# Altium footprint library Generic Footprint.PcbLib: 160 footprints (part 8 of 20)
Each footprint in its own frame and in the unit in brackets; x right, y up, seen from the top. Pads: shape width x height; smd on the part's side, far side on the other; paste and mask are expansions set on the pad; w line width, h text height; cw(c..) or ccw(c..) is an arc to the next point about the centre after c.
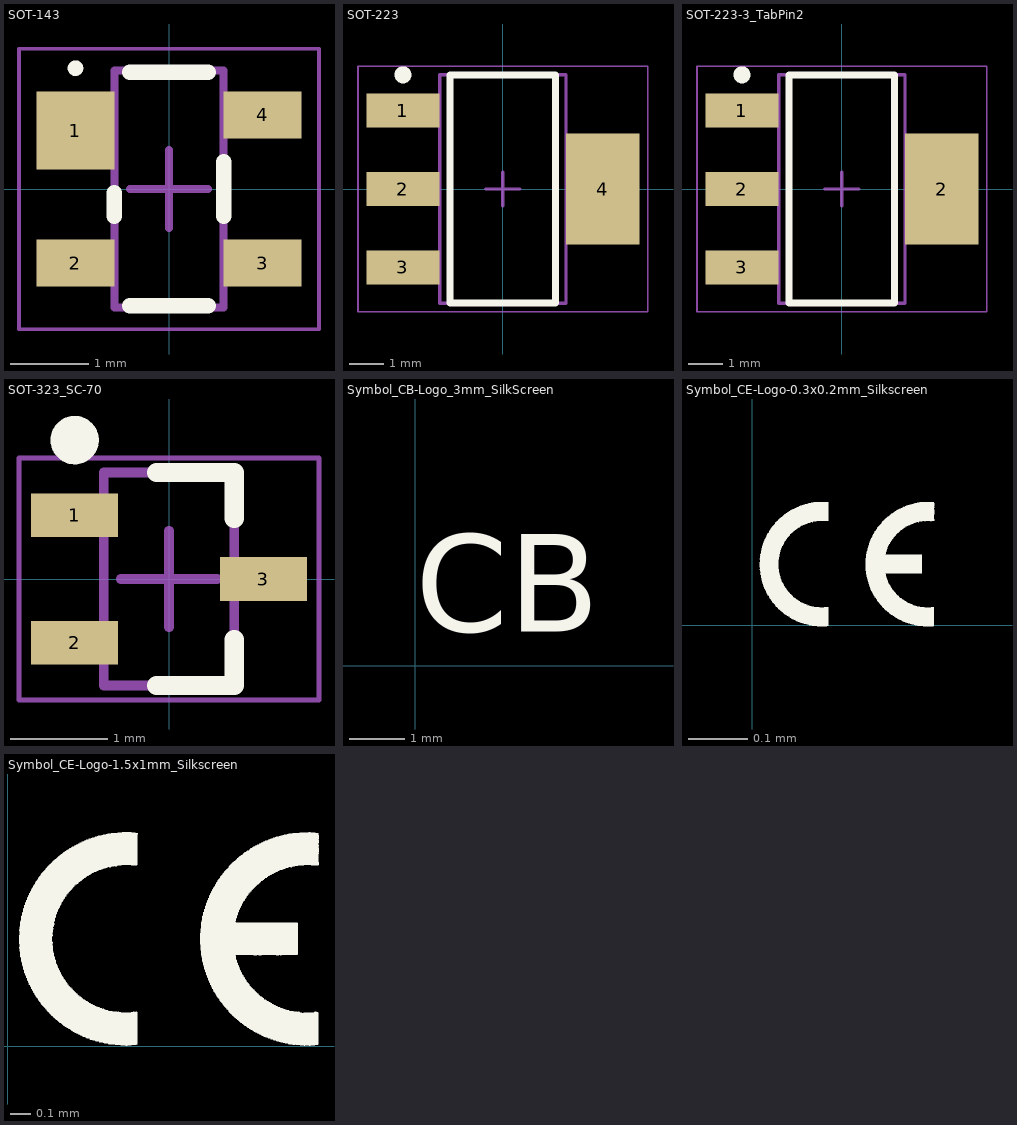
[diagram p7: the footprints below, top view; thin cyan lines are the x and y axes]

## SOT-143 [mm] "SOT143, 4-Leads, Body 2.92x2.37mm, Pitch 1.90mm, IPC Medium Density"
height 1.2
pads (4):
  rect 1x1 smd: 1(-1.2,0.75)
  rect 1x0.6 smd: 2(-1.2,-0.95) 3(1.2,-0.95) 4(1.2,0.95)
Top Overlay:
  circle w0.1: c-1.2,1.55 r0.05
  lines w0.2: -0.7,-0.35 -0.7,-0.05 ; -0.5,-1.5 0.5,-1.5 ; -0.5,1.5 0.5,1.5 ; 0.7,-0.35 0.7,0.35
Courtyard Top:
  lines w0.05: -1.925,-1.8 -1.925,1.8 1.925,1.8 1.925,-1.8 -1.925,-1.8
  lines w0.1: -0.5,0 0.5,0 ; 0,-0.5 0,0.5
Assembly Top:
  lines w0.1: -0.7,-1.52 -0.7,1.52 0.7,1.52 0.7,-1.52 -0.7,-1.52
3D body "SOT-143.step": height 1.2, standoff 0.12, extent -0.855,-1.52 0.855,1.52

## SOT-223 [mm] "SOT223, 4-Leads, Body 6.50x7.00mm (avg), Pitch 2.30mm, IPC Medium Density"
height 1.8
pads (4):
  rect 2.15x1 smd: 1(-2.93,2.3) 2(-2.93,0) 3(-2.93,-2.3)
  rect 2.15x3.25 smd: 4(2.93,0)
Top Overlay:
  circle w0.25: c-2.93,3.35 r0.125
  lines w0.2: -1.55,-3.35 1.55,-3.35 1.55,3.35 -1.55,3.35 -1.55,-3.35
Courtyard Top:
  lines w0.05: -4.25,-3.6 4.25,-3.6 4.25,3.6 -4.25,3.6 -4.25,-3.6
  lines w0.1: -0.5,0 0.5,0 ; 0,-0.5 0,0.5
Assembly Top:
  lines w0.1: -1.855,-3.35 1.855,-3.35 1.855,3.35 -1.855,3.35 -1.855,-3.35
3D body "SOT-223-3_TabPin2.step": height 1.8, standoff 0, extent -3.5,-3.35 3.5,3.35

## SOT-223-3_TabPin2 [mm] "SOT223, 4-Leads, Body 6.50x7.00mm (avg), Pitch 2.30mm, IPC Medium Density"
height 1.8
pads (4):
  rect 2.15x1 smd: 1(-2.93,2.3) 2(-2.93,0) 3(-2.93,-2.3)
  rect 2.15x3.25 smd: 2(2.93,0)
Top Overlay:
  circle w0.25: c-2.93,3.35 r0.125
  lines w0.2: -1.55,-3.35 1.55,-3.35 1.55,3.35 -1.55,3.35 -1.55,-3.35
Courtyard Top:
  lines w0.05: -4.25,-3.6 4.25,-3.6 4.25,3.6 -4.25,3.6 -4.25,-3.6
  lines w0.1: -0.5,0 0.5,0 ; 0,-0.5 0,0.5
Assembly Top:
  lines w0.1: -1.855,-3.35 1.855,-3.35 1.855,3.35 -1.855,3.35 -1.855,-3.35
3D body "SOT-223-3_TabPin2.step": height 1.8, standoff 0, extent -3.5,-3.35 3.5,3.35

## SOT-323_SC-70 [mm] "SOT323 SC70-3, 3-Leads, Body 2.00x2.20mm, Pitch 0.66mm, IPC Medium Density"
height 0.9
pads (3):
  rect 0.9x0.45 smd: 1(-0.975,0.66) 2(-0.975,-0.66) 3(0.975,0)
Top Overlay:
  circle w0.25: c-0.975,1.435 r0.125
  lines w0.2: -0.125,-1.1 0.675,-1.1 0.675,-0.625 ; -0.125,1.1 0.675,1.1 0.675,0.625
Courtyard Top:
  lines w0.05: -1.55,-1.25 -1.55,1.25 1.55,1.25 1.55,-1.25 -1.55,-1.25
  lines w0.1: -0.5,0 0.5,0 ; 0,-0.5 0,0.5
Assembly Top:
  lines w0.1: -0.675,-1.1 -0.675,1.1 0.675,1.1 0.675,-1.1 -0.675,-1.1
3D body "SOT-323_SC-70.step": height 0.9, standoff 0, extent -1.1,-1.098 1.1,1.098

## Symbol_CB-Logo_3mm_SilkScreen [mm]
Top Overlay:
  text "CB" at 0,0.033 h3

## Symbol_CE-Logo-0.3x0.2mm_Silkscreen [mm]
Top Overlay:
  drawing of 1554 lines, arcs and shapes, not listed

## Symbol_CE-Logo-1.5x1mm_Silkscreen [mm]
pads (3108):
  round 0.01 on Top Overlay: 1(0.061,0.488) 1(0.061,0.511) 1(0.061,0.512) 1(0.061,0.514) 1(0.061,0.515) 1(0.061,0.517) 1(0.061,0.518) 1(0.061,0.52) 1(0.061,0.524) 1(0.061,0.526) 1(0.061,0.527) 1(0.061,0.529) 1(0.061,0.53) 1(0.061,0.532) 1(0.061,0.533) 1(0.061,0.535) 1(0.061,0.536) 1(0.061,0.538) 1(0.061,0.539) 1(0.061,0.541) 1(0.061,0.542) 1(0.061,0.544) 1(0.061,0.545) 1(0.061,0.547) 1(0.061,0.548) 1(0.061,0.575) 1(0.062,0.476) 1(0.062,0.478) 1(0.062,0.479) 1(0.062,0.481) 1(0.062,0.482) 1(0.062,0.49) 1(0.062,0.491) 1(0.062,0.493) 1(0.062,0.494) 1(0.062,0.496) 1(0.062,0.497) 1(0.062,0.499) 1(0.062,0.5) 1(0.062,0.502) 1(0.062,0.503) 1(0.062,0.505) 1(0.062,0.506) 1(0.062,0.508) 1(0.062,0.509) 1(0.062,0.521) 1(0.062,0.523) 1(0.062,0.55) 1(0.062,0.551) 1(0.062,0.553) 1(0.062,0.554) 1(0.062,0.556) 1(0.062,0.557) 1(0.062,0.559) 1(0.062,0.56) 1(0.062,0.562) 1(0.062,0.563) 1(0.062,0.565) 1(0.062,0.566) 1(0.062,0.568) 1(0.062,0.569) 1(0.062,0.571) 1(0.062,0.572) 1(0.062,0.574) 1(0.062,0.584) 1(0.062,0.586) 1(0.064,0.473) 1(0.064,0.475) 1(0.064,0.484) 1(0.064,0.485) 1(0.064,0.487) 1(0.064,0.577) 1(0.064,0.578) 1(0.064,0.58) 1(0.064,0.581) 1(0.064,0.583) 1(0.064,0.587) 1(0.064,0.589) 1(0.064,0.59) 1(0.065,0.449) 1(0.065,0.592) 1(0.065,0.599) 1(0.065,0.601) 1(0.065,0.602) 1(0.065,0.616) 1(0.067,0.445) 1(0.067,0.446) 1(0.067,0.448) 1(0.067,0.454) 1(0.067,0.455) 1(0.067,0.457) 1(0.067,0.458) 1(0.067,0.46) 1(0.067,0.461) 1(0.067,0.463) 1(0.067,0.464) 1(0.067,0.466) 1(0.067,0.467) 1(0.067,0.469) 1(0.067,0.47) 1(0.067,0.472) 1(0.067,0.593) 1(0.067,0.595) 1(0.067,0.596) 1(0.067,0.598) 1(0.067,0.604) 1(0.067,0.605) 1(0.067,0.607) 1(0.067,0.608) 1(0.067,0.61) 1(0.068,0.451) 1(0.068,0.452) 1(0.068,0.611) 1(0.068,0.613) 1(0.068,0.614) 1(0.068,0.617) 1(0.068,0.619) 1(0.068,0.62) 1(0.071,0.424) 1(0.071,0.425) 1(0.071,0.427) 1(0.071,0.428) 1(0.071,0.43) 1(0.071,0.431) 1(0.071,0.433) 1(0.071,0.434) 1(0.071,0.436) 1(0.071,0.437) 1(0.071,0.439) 1(0.071,0.44) 1(0.071,0.443) 1(0.071,0.622) 1(0.071,0.623) 1(0.071,0.625) 1(0.071,0.626) 1(0.071,0.628) 1(0.071,0.629) 1(0.071,0.631) 1(0.071,0.632) 1(0.071,0.634) 1(0.071,0.635) 1(0.071,0.637) 1(0.071,0.638) 1(0.071,0.644) 1(0.073,0.421) 1(0.073,0.422) 1(0.073,0.442) 1(0.073,0.64) 1(0.073,0.641) 1(0.073,0.643) 1(0.076,0.404) 1(0.076,0.407) 1(0.076,0.409) 1(0.076,0.41) 1(0.076,0.412) 1(0.076,0.413) 1(0.076,0.415) 1(0.076,0.416) 1(0.076,0.418) 1(0.076,0.419) 1(0.076,0.646) 1(0.076,0.647) 1(0.076,0.649) 1(0.076,0.65) 1(0.076,0.652) 1(0.076,0.653) 1(0.076,0.655) 1(0.076,0.656) 1(0.076,0.658) 1(0.076,0.661) 1(0.077,0.401) 1(0.077,0.403) 1(0.077,0.406) 1(0.077,0.659) 1(0.077,0.662) 1(0.079,0.664) 1(0.08,0.394) 1(0.08,0.395) 1(0.08,0.397) 1(0.08,0.4) 1(0.08,0.671) 1(0.08,0.673) 1(0.08,0.674) 1(0.08,0.68) 1(0.082,0.385) 1(0.082,0.386) 1(0.082,0.388) 1(0.082,0.389) 1(0.082,0.391) 1(0.082,0.392) 1(0.082,0.398) 1(0.082,0.665) 1(0.082,0.667) 1(0.082,0.668) 1(0.082,0.67) 1(0.082,0.676) 1(0.082,0.677) 1(0.082,0.679) 1(0.083,0.382) 1(0.083,0.383) 1(0.083,0.682) 1(0.083,0.683) 1(0.085,0.371) 1(0.085,0.694) 1(0.086,0.368) 1(0.086,0.37) 1(0.086,0.373) 1(0.086,0.374) 1(0.086,0.376) 1(0.086,0.377) 1(0.086,0.379) 1(0.086,0.38) 1(0.086,0.685) 1(0.086,0.686) 1(0.086,0.688) 1(0.086,0.689) 1(0.086,0.691) 1(0.086,0.692) 1(0.086,0.697) 1(0.088,0.367) 1(0.088,0.695) 1(0.091,0.358) 1(0.091,0.359) 1(0.091,0.361) 1(0.091,0.362) 1(0.091,0.364) 1(0.091,0.365) 1(0.091,0.698) 1(0.091,0.7) 1(0.091,0.701) 1(0.091,0.703) 1(0.091,0.704) 1(0.091,0.706) 1(0.091,0.707) 1(0.091,0.709) 1(0.092,0.353) 1(0.092,0.355) 1(0.092,0.356) 1(0.092,0.71) 1(0.092,0.712) 1(0.094,0.352) 1(0.095,0.344) 1(0.095,0.347) 1(0.095,0.35) 1(0.095,0.713) 1(0.095,0.715) 1(0.095,0.718) 1(0.095,0.721) 1(0.097,0.346) 1(0.097,0.349) 1(0.097,0.716) 1(0.097,0.719) 1(0.098,0.343) 1(0.1,0.331) 1(0.1,0.332) 1(0.1,0.334) 1(0.1,0.335) 1(0.1,0.337) 1(0.1,0.338) 1(0.1,0.34) 1(0.1,0.341) 1(0.1,0.722) 1(0.1,0.724) 1(0.1,0.725) 1(0.1,0.727) 1(0.1,0.728) 1(0.1,0.73) 1(0.1,0.731) 1(0.101,0.329) 1(0.101,0.733) 1(0.101,0.736) 1(0.103,0.328) 1(0.103,0.734) 1(0.104,0.737) 1(0.104,0.742) 1(0.106,0.32) 1(0.106,0.322) 1(0.106,0.323) 1(0.106,0.325) 1(0.106,0.326) 1(0.106,0.739) 1(0.106,0.74) 1(0.106,0.743) 1(0.106,0.745) 1(0.107,0.319) 1(0.109,0.31) 1(0.109,0.746) 1(0.11,0.311) 1(0.11,0.313) 1(0.11,0.314) 1(0.11,0.316) 1(0.11,0.317) 1(0.11,0.748) 1(0.11,0.749) 1(0.11,0.751) 1(0.11,0.752) 1(0.11,0.754) 1(0.11,0.755) 1(0.113,0.308) 1(0.115,0.301) 1(0.115,0.302) 1(0.115,0.304) 1(0.115,0.305) 1(0.115,0.307) 1(0.115,0.757) 1(0.115,0.758) 1(0.115,0.76) 1(0.115,0.761) 1(0.115,0.763) 1(0.116,0.299) 1(0.116,0.764) 1(0.119,0.29) 1(0.119,0.292) 1(0.119,0.293) 1(0.119,0.295) 1(0.119,0.296) 1(0.119,0.298) 1(0.119,0.766) 1(0.119,0.767) 1(0.119,0.769) 1(0.119,0.77) 1(0.119,0.772) 1(0.119,0.773) 1(0.121,0.775) 1(0.122,0.289) 1(0.124,0.287) 1(0.124,0.776) 1(0.124,0.778) 1(0.124,0.781) 1(0.125,0.281) 1(0.125,0.283) 1(0.125,0.284) 1(0.125,0.286) 1(0.125,0.779) 1(0.125,0.782) 1(0.125,0.784) 1(0.127,0.28) 1(0.13,0.274) 1(0.13,0.275) 1(0.13,0.277) 1(0.13,0.278) 1(0.13,0.785) 1(0.13,0.787) 1(0.13,0.788) 1(0.13,0.79) 1(0.13,0.791) 1(0.13,0.793) 1(0.131,0.271) 1(0.131,0.272) 1(0.133,0.794) 1(0.134,0.268) 1(0.134,0.269) 1(0.134,0.796) 1(0.134,0.797) 1(0.134,0.799) 1(0.136,0.266) 1(0.139,0.259) 1(0.139,0.26) 1(0.139,0.262) 1(0.139,0.263) 1(0.139,0.265) 1(0.139,0.8) 1(0.139,0.802) 1(0.139,0.803) 1(0.14,0.256) 1(0.14,0.257) 1(0.14,0.805) 1(0.14,0.806) 1(0.14,0.808) 1(0.143,0.25) 1(0.143,0.251) 1(0.143,0.253) 1(0.143,0.254) 1(0.143,0.809) 1(0.143,0.811) 1(0.143,0.812) 1(0.143,0.814) 1(0.143,0.815) 1(0.145,0.248) 1(0.145,0.817) 1(0.146,0.247) 1(0.146,0.818) 1(0.148,0.244) 1(0.148,0.245) 1(0.148,0.818) 1(0.149,0.242) 1(0.149,0.818) 1(0.149,0.82) 1(0.149,0.821) 1(0.149,0.823) 1(0.152,0.824) 1(0.154,0.236) 1(0.154,0.238) 1(0.154,0.239) 1(0.154,0.241) 1(0.154,0.826) 1(0.154,0.827) 1(0.154,0.829) 1(0.155,0.83) 1(0.155,0.832) 1(0.158,0.229) 1(0.158,0.23) 1(0.158,0.232) 1(0.158,0.233) 1(0.158,0.235) 1(0.158,0.833) 1(0.158,0.835) 1(0.158,0.836) 1(0.16,0.227) 1(0.163,0.224) 1(0.163,0.226) 1(0.163,0.838) 1(0.163,0.839) 1(0.163,0.842) 1(0.164,0.223) 1(0.164,0.841) 1(0.167,0.217) 1(0.167,0.218) 1(0.167,0.22) 1(0.167,0.221) 1(0.167,0.844) 1(0.167,0.845) 1(0.167,0.847) 1(0.167,0.848) 1(0.169,0.214) 1(0.169,0.215) 1(0.169,0.85) 1(0.169,0.851) 1(0.172,0.209) 1(0.172,0.212) 1(0.172,0.853) 1(0.173,0.211) 1(0.173,0.854) 1(0.173,0.856) 1(0.175,0.208) 1(0.178,0.203) 1(0.178,0.205) 1(0.178,0.206) 1(0.178,0.857) 1(0.178,0.859) 1(0.178,0.86) 1(0.179,0.862) 1(0.182,0.199) 1(0.182,0.2) 1(0.182,0.202) 1(0.182,0.863) 1(0.182,0.865) 1(0.182,0.866) 1(0.187,0.194) 1(0.187,0.196) 1(0.187,0.197) 1(0.187,0.868) 1(0.187,0.869) 1(0.187,0.871) 1(0.19,0.193) 1(0.191,0.188) 1(0.191,0.19) 1(0.191,0.191) 1(0.191,0.872) 1(0.191,0.874) 1(0.191,0.875) 1(0.191,0.877) 1(0.193,0.878) 1(0.193,0.88) 1(0.194,0.188) 1(0.196,0.184) 1(0.196,0.188) 1(0.196,0.881) 1(0.197,0.181) 1(0.197,0.182) 1(0.197,0.185) 1(0.197,0.187) 1(0.197,0.883) 1(0.197,0.884) 1(0.199,0.179) 1(0.199,0.886) 1(0.202,0.175) 1(0.202,0.176) 1(0.202,0.178) 1(0.202,0.887) 1(0.202,0.889) 1(0.202,0.89) 1(0.205,0.173) 1(0.206,0.892) 1(0.206,0.893) 1(0.206,0.895) 1(0.208,0.17) 1(0.208,0.172) 1(0.209,0.169) 1(0.211,0.166) 1(0.211,0.167) 1(0.211,0.896) 1(0.211,0.898) 1(0.211,0.899) 1(0.214,0.164) 1(0.215,0.163) 1(0.215,0.506) 1(0.215,0.508) 1(0.215,0.509) 1(0.215,0.511) 1(0.215,0.517) 1(0.215,0.518) 1(0.215,0.52) 1(0.215,0.521) 1(0.215,0.523) 1(0.215,0.524) 1(0.215,0.526) 1(0.215,0.527) 1(0.215,0.529) 1(0.215,0.53) 1(0.215,0.532) 1(0.215,0.533) 1(0.215,0.535) 1(0.215,0.536) 1(0.215,0.538) 1(0.215,0.539) 1(0.215,0.541) 1(0.215,0.542) 1(0.215,0.544) 1(0.215,0.545) 1(0.215,0.547) 1(0.215,0.548) 1(0.215,0.554) 1(0.215,0.556) 1(0.215,0.557) 1(0.215,0.559) 1(0.215,0.901) 1(0.215,0.902) 1(0.217,0.16) 1(0.217,0.161) 1(0.217,0.5) 1(0.217,0.502) 1(0.217,0.503) 1(0.217,0.505) 1(0.217,0.512) 1(0.217,0.515) 1(0.217,0.55) 1(0.217,0.56) 1(0.217,0.562) 1(0.217,0.563) 1(0.217,0.565) 1(0.217,0.566) 1(0.217,0.904) 1(0.218,0.485) 1(0.218,0.487) 1(0.218,0.488) 1(0.218,0.491) 1(0.218,0.493) 1(0.218,0.494) 1(0.218,0.496) 1(0.218,0.497) 1(0.218,0.499) 1(0.218,0.514) 1(0.218,0.551) 1(0.218,0.553) 1(0.218,0.568) 1(0.218,0.569) 1(0.218,0.571) 1(0.218,0.572) 1(0.218,0.574) 1(0.218,0.575) 1(0.218,0.578) 1(0.218,0.58) 1(0.218,0.581) 1(0.218,0.583) 1(0.218,0.589) 1(0.218,0.596) 1(0.22,0.467) 1(0.22,0.469) 1(0.22,0.47) 1(0.22,0.472) 1(0.22,0.473) 1(0.22,0.475) 1(0.22,0.476) 1(0.22,0.478) 1(0.22,0.479) 1(0.22,0.481) 1(0.22,0.482) 1(0.22,0.484) 1(0.22,0.49) 1(0.22,0.577) 1(0.22,0.586) 1(0.22,0.587) 1(0.22,0.59) 1(0.22,0.592) 1(0.22,0.593) 1(0.22,0.595) 1(0.22,0.905) 1(0.221,0.155) 1(0.221,0.157) 1(0.221,0.158) 1(0.221,0.584) 1(0.221,0.598) 1(0.221,0.907) 1(0.221,0.908) 1(0.223,0.457) 1(0.223,0.461) 1(0.223,0.463) 1(0.223,0.464) 1(0.223,0.466) 1(0.223,0.598) 1(0.223,0.599) 1(0.223,0.601) 1(0.223,0.602) 1(0.223,0.91) 1(0.224,0.443) 1(0.224,0.445) 1(0.224,0.446) 1(0.224,0.448) 1(0.224,0.449) 1(0.224,0.451) 1(0.224,0.452) 1(0.224,0.454) 1(0.224,0.455) 1(0.224,0.458) 1(0.224,0.46) 1(0.224,0.598) 1(0.224,0.604) 1(0.224,0.61) 1(0.224,0.611) 1(0.224,0.613) 1(0.224,0.614) 1(0.224,0.616) 1(0.224,0.617) 1(0.224,0.619) 1(0.224,0.62) 1(0.226,0.152) 1(0.226,0.154) 1(0.226,0.605) 1(0.226,0.607) 1(0.226,0.608) 1(0.226,0.622) 1(0.226,0.911) 1(0.226,0.913) 1(0.226,0.914) 1(0.227,0.151) 1(0.227,0.44) 1(0.227,0.626) 1(0.229,0.149) 1(0.229,0.428) 1(0.229,0.43) 1(0.229,0.431) 1(0.229,0.433) 1(0.229,0.434) 1(0.229,0.436) 1(0.229,0.437) 1(0.229,0.439) 1(0.229,0.442) 1(0.229,0.623) 1(0.229,0.625) 1(0.229,0.628) 1(0.229,0.629) 1(0.229,0.631) 1(0.229,0.632) 1(0.229,0.634) 1(0.229,0.64) 1(0.23,0.148) 1(0.23,0.635) 1(0.23,0.637) 1(0.23,0.638) 1(0.23,0.916) 1(0.23,0.917) 1(0.232,0.146) 1(0.232,0.424) 1(0.232,0.425) 1(0.232,0.641) 1(0.232,0.919) 1(0.233,0.145) 1(0.233,0.41) 1(0.233,0.413) 1(0.233,0.415) 1(0.233,0.416) 1(0.233,0.418) 1(0.233,0.419) 1(0.233,0.421) 1(0.233,0.422) 1(0.233,0.427) 1(0.233,0.644) 1(0.233,0.649) 1(0.233,0.65) 1(0.233,0.652) 1(0.235,0.409) 1(0.235,0.412) 1(0.235,0.643) 1(0.235,0.646) 1(0.235,0.647) 1(0.235,0.653) 1(0.235,0.655) 1(0.235,0.92) 1(0.235,0.922) 1(0.236,0.656) 1(0.238,0.401) 1(0.238,0.406) 1(0.238,0.407) 1(0.238,0.658) 1(0.238,0.659) 1(0.238,0.661) 1(0.238,0.662) 1(0.238,0.665) 1(0.238,0.668) 1(0.238,0.923) 1(0.239,0.14) 1(0.239,0.4) 1(0.239,0.403) 1(0.239,0.404) 1(0.239,0.664) 1(0.239,0.667) 1(0.239,0.67) 1(0.241,0.137) 1(0.241,0.139) 1(0.241,0.142) 1(0.241,0.143) 1(0.242,0.136) 1(0.242,0.386) 1(0.242,0.389) 1(0.242,0.394) 1(0.242,0.395) 1(0.242,0.397) 1(0.242,0.398) 1(0.242,0.673) 1(0.242,0.677) 1(0.244,0.385) 1(0.244,0.388) 1(0.244,0.391) 1(0.244,0.392) 1(0.244,0.671) 1(0.244,0.674) 1(0.244,0.676) 1(0.244,0.679) 1(0.244,0.925) 1(0.244,0.928) 1(0.245,0.68) 1(0.245,0.926) 1(0.245,0.929) 1(0.247,0.682) 1(0.248,0.376) 1(0.248,0.377) 1(0.248,0.379) 1(0.248,0.38) 1(0.248,0.382) 1(0.248,0.383) 1(0.248,0.683) 1(0.248,0.685) 1(0.248,0.686) 1(0.248,0.688) 1(0.25,0.131) 1(0.25,0.133) 1(0.25,0.134) 1(0.25,0.689) 1(0.25,0.931) 1(0.25,0.932) 1(0.25,0.934) 1(0.251,0.691) 1(0.253,0.367) 1(0.253,0.368) 1(0.253,0.37) 1(0.253,0.373) 1(0.253,0.374) 1(0.253,0.692) 1(0.253,0.694) 1(0.253,0.695) 1(0.253,0.697) 1(0.254,0.127) 1(0.254,0.128) 1(0.254,0.13) 1(0.254,0.365) 1(0.254,0.371) 1(0.254,0.698) 1(0.254,0.935) 1(0.254,0.937) 1(0.254,0.938) 1(0.256,0.7) 1(0.257,0.125) 1(0.257,0.364) 1(0.257,0.701) 1(0.257,0.703) 1(0.257,0.704) 1(0.259,0.124) 1(0.259,0.356) 1(0.259,0.358) 1(0.259,0.359) 1(0.259,0.361) 1(0.259,0.362) 1(0.259,0.706) 1(0.259,0.707) 1(0.259,0.94) 1(0.26,0.122) 1(0.26,0.941) 1(0.26,0.943) 1(0.262,0.121) 1(0.262,0.349) 1(0.262,0.352) 1(0.262,0.353) 1(0.262,0.355) 1(0.262,0.709) 1(0.262,0.71) 1(0.262,0.712) 1(0.262,0.713) 1(0.262,0.715) 1(0.263,0.121) 1(0.263,0.347) 1(0.263,0.35) 1(0.263,0.716) 1(0.263,0.718) 1(0.263,0.944) 1(0.265,0.121) 1(0.265,0.946) 1(0.266,0.121) 1(0.266,0.343) 1(0.266,0.346) 1(0.266,0.719) 1(0.266,0.947) 1(0.268,0.121) 1(0.268,0.341) 1(0.268,0.344) 1(0.268,0.721) 1(0.268,0.722) 1(0.268,0.724) 1(0.268,0.725) 1(0.268,0.727) 1(0.268,0.949) 1(0.269,0.116) 1(0.269,0.118) 1(0.269,0.119) 1(0.269,0.949) 1(0.271,0.116) 1(0.271,0.34) 1(0.272,0.116) 1(0.272,0.332) 1(0.272,0.334) 1(0.272,0.335) 1(0.272,0.337) 1(0.272,0.338) 1(0.272,0.728) 1(0.272,0.73) 1(0.272,0.731) 1(0.274,0.112) 1(0.274,0.113) 1(0.274,0.115) 1(0.274,0.733) 1(0.274,0.949) 1(0.274,0.95) 1(0.274,0.952) 1(0.274,0.953) 1(0.277,0.329) 1(0.277,0.331) 1(0.277,0.734) 1(0.277,0.736) 1(0.278,0.107) 1(0.278,0.109) 1(0.278,0.11) 1(0.278,0.328) 1(0.278,0.737) 1(0.278,0.739) 1(0.278,0.74) 1(0.278,0.742) 1(0.278,0.955) 1(0.278,0.956) 1(0.28,0.326) 1(0.28,0.958) 1(0.281,0.32) 1(0.281,0.323) 1(0.281,0.325) 1(0.281,0.743) 1(0.283,0.317) 1(0.283,0.319) 1(0.283,0.322) 1(0.283,0.745) 1(0.283,0.746) 1(0.283,0.748) 1(0.284,0.748) 1(0.284,0.959) 1(0.284,0.961) 1(0.286,0.748) 1(0.286,0.749) 1(0.286,0.752) 1(0.286,0.755) 1(0.286,0.962) 1(0.287,0.103) 1(0.287,0.106) 1(0.287,0.313) 1(0.287,0.314) 1(0.287,0.316) 1(0.287,0.751) 1(0.287,0.754) 1(0.287,0.757) 1(0.289,0.101) 1(0.289,0.104) 1(0.29,0.311) 1(0.292,0.304) 1(0.292,0.305) 1(0.292,0.307) 1(0.292,0.308) 1(0.292,0.31) 1(0.292,0.758) 1(0.292,0.76) 1(0.293,0.098) 1(0.293,0.1) 1(0.293,0.302) 1(0.293,0.761) 1(0.293,0.964) 1(0.293,0.965) 1(0.293,0.967) 1(0.295,0.302) 1(0.295,0.968) 1(0.296,0.097) 1(0.296,0.299) 1(0.296,0.301) 1(0.296,0.302) 1(0.296,0.763) 1(0.296,0.764) 1(0.296,0.766) 1(0.296,0.968) 1(0.298,0.298) 1(0.298,0.968) 1(0.298,0.97) 1(0.299,0.767) 1(0.299,0.971) 1(0.301,0.296) 1(0.301,0.769) 1(0.302,0.094) 1(0.302,0.095) 1(0.302,0.293) 1(0.302,0.295) 1(0.302,0.77) 1(0.304,0.092) 1(0.304,0.772) 1(0.305,0.292) 1(0.305,0.773) 1(0.307,0.289) 1(0.307,0.29) 1(0.307,0.775) 1(0.307,0.776) 1(0.307,0.976) 1(0.308,0.973) 1(0.308,0.974) 1(0.308,0.977) 1(0.31,0.778) 1(0.311,0.284) 1(0.311,0.286) 1(0.311,0.287) 1(0.311,0.779) 1(0.311,0.781) 1(0.313,0.088) 1(0.313,0.089) 1(0.313,0.091) 1(0.314,0.782) 1(0.316,0.278) 1(0.316,0.28) 1(0.316,0.281) 1(0.316,0.283) 1(0.316,0.784) 1(0.316,0.785) 1(0.316,0.787) 1(0.316,0.788) 1(0.316,0.79) 1(0.317,0.083) 1(0.317,0.085) 1(0.317,0.086) 1(0.317,0.791) 1(0.317,0.979) 1(0.317,0.98) 1(0.317,0.982) 1(0.319,0.791) 1(0.32,0.082) 1(0.32,0.274) 1(0.32,0.277) 1(0.32,0.793) 1(0.32,0.794) 1(0.322,0.275) 1(0.322,0.791) 1(0.322,0.796) 1(0.322,0.983) 1(0.322,0.985) 1(0.323,0.082) 1(0.323,0.796) 1(0.323,0.986) 1(0.325,0.271) 1(0.325,0.272) 1(0.325,0.796) 1(0.325,0.799) 1(0.326,0.077) 1(0.326,0.079) 1(0.326,0.082) 1(0.326,0.269) 1(0.326,0.797) 1(0.326,0.8) 1(0.328,0.08) 1(0.329,0.268) 1(0.329,0.803) 1(0.331,0.266) 1(0.331,0.802) 1(0.331,0.805) 1(0.332,0.074) 1(0.332,0.076) 1(0.332,0.265) 1(0.332,0.988) 1(0.332,0.989) 1(0.332,0.991) 1(0.334,0.263) 1(0.335,0.26) 1(0.335,0.262) 1(0.337,0.073) 1(0.338,0.806) 1(0.34,0.256) 1(0.34,0.257) 1(0.34,0.259) 1(0.34,0.808) 1(0.34,0.809) 1(0.341,0.07) 1(0.341,0.071) 1(0.341,0.254) 1(0.341,0.992) 1(0.341,0.994) 1(0.341,0.995) 1(0.344,0.068) 1(0.344,0.25) 1(0.344,0.251) 1(0.344,0.253) 1(0.344,0.811) 1(0.344,0.812) 1(0.344,0.814) 1(0.344,0.997) 1(0.346,0.815) 1(0.349,0.247) 1(0.349,0.817) 1(0.349,0.818) 1(0.349,0.997) 1(0.35,0.067) 1(0.35,0.245) 1(0.35,0.248) 1(0.35,0.997) 1(0.35,0.998) 1(0.35,1) 1(0.352,0.065) 1(0.352,1.001) 1(0.353,0.064) 1(0.353,0.82) 1(0.353,0.823) 1(0.355,0.821) 1(0.355,0.824) 1(0.358,0.244) 1(0.359,0.062) 1(0.359,0.241) 1(0.359,0.242) 1(0.361,0.061) 1(0.361,1.003) 1(0.361,1.004) 1(0.361,1.006) 1(0.362,0.059) 1(0.362,0.239) 1(0.364,0.236) 1(0.364,0.238) 1(0.364,0.826) 1(0.364,0.827) 1(0.364,0.829) 1(0.365,0.235) 1(0.367,0.235) 1(0.367,0.83) 1(0.368,0.058) 1(0.368,0.232) 1(0.368,0.235) 1(0.368,0.832) 1(0.368,0.833) 1(0.37,0.056) 1(0.37,0.23) 1(0.37,0.233) 1(0.37,1.007) 1(0.37,1.009) 1(0.37,1.01) 1(0.371,0.055) 1(0.373,0.835) 1(0.373,0.836) 1(0.374,0.053) 1(0.374,0.838) 1(0.376,0.053) 1(0.376,0.839) 1(0.377,0.053) 1(0.377,0.229) 1(0.377,0.839) 1(0.379,0.227) 1(0.379,0.839) 1(0.379,1.012) 1(0.379,1.013) 1(0.38,0.226) 1(0.382,0.841) 1(0.382,1.015) 1(0.383,0.221) 1(0.383,0.223) 1(0.383,0.224) 1(0.383,0.842) 1(0.383,0.844) 1(0.385,0.05) 1(0.385,0.052) 1(0.385,0.844) 1(0.386,0.049) 1(0.386,0.844) 1(0.388,0.845) 1(0.388,0.847) 1(0.389,0.22) 1(0.389,0.848) 1(0.389,1.016) 1(0.389,1.018) 1(0.389,1.019) 1(0.391,0.22) 1(0.392,0.217) 1(0.392,0.218) 1(0.392,0.22) 1(0.394,0.046) 1(0.394,0.047) 1(0.395,1.021) 1(0.397,0.212) 1(0.397,0.85) 1(0.398,0.044) 1(0.398,0.211) 1(0.398,0.214) 1(0.398,0.215) 1(0.398,0.851) 1(0.398,0.853) 1(0.398,1.021) 1(0.4,1.021) 1(0.403,0.854) 1(0.403,1.022) 1(0.404,0.211) 1(0.404,1.024) 1(0.404,1.025) 1(0.406,0.211) 1(0.406,1.025) 1(0.407,0.043) 1(0.407,0.206) 1(0.407,0.208) 1(0.407,0.856) 1(0.407,0.857) 1(0.407,1.025) 1(0.409,0.038) 1(0.409,0.04) 1(0.409,0.041) 1(0.409,0.209) 1(0.41,0.859) 1(0.412,0.038) 1(0.412,0.86) 1(0.412,0.862) 1(0.413,0.863) 1(0.415,0.863) 1(0.418,0.038) 1(0.418,0.202) 1(0.418,0.203) 1(0.418,0.205) 1(0.418,1.027) 1(0.418,1.028) 1(0.419,0.038) 1(0.419,0.863) 1(0.419,1.03) 1(0.421,0.038) 1(0.421,0.866) 1(0.421,1.03) 1(0.422,0.865) 1(0.422,0.868) 1(0.422,1.03) 1(0.424,0.035) 1(0.424,0.037) 1(0.427,0.197) 1(0.427,0.199) 1(0.427,0.2) 1(0.428,0.034) 1(0.433,1.031) 1(0.433,1.033) 1(0.434,0.196) 1(0.434,1.034) 1(0.436,0.869) 1(0.436,0.871) 1(0.437,0.031) 1(0.437,0.032) 1(0.437,0.872) 1(0.439,0.194) 1(0.44,0.029) 1(0.44,0.193) 1(0.442,0.029) 1(0.442,1.036) 1(0.443,0.029) 1(0.443,1.036) 1(0.445,0.874) 1(0.445,0.875) 1(0.446,0.191) 1(0.446,0.877) 1(0.446,1.036) 1(0.446,1.037) 1(0.451,0.187) 1(0.451,0.188) 1(0.451,0.19) 1(0.451,1.039) 1(0.451,1.04) 1(0.452,1.04) 1(0.454,0.878) 1(0.455,0.187) 1(0.455,0.878) 1(0.455,0.88) 1(0.455,0.881) 1(0.457,0.025) 1(0.457,0.026) 1(0.457,0.028) 1(0.457,0.187) 1(0.457,0.878) 1(0.457,0.883) 1(0.458,0.883) 1(0.46,0.025) 1(0.46,1.04) 1(0.461,0.025) 1(0.461,0.187) 1(0.461,1.04) 1(0.463,0.185) 1(0.463,0.187) 1(0.464,0.182) 1(0.464,0.184) 1(0.466,0.883) 1(0.466,1.04) 1(0.467,1.042) 1(0.469,1.043) 1(0.47,0.884) 1(0.47,0.886) 1(0.472,0.887) 1(0.473,0.182) 1(0.473,0.887) 1(0.475,0.181) 1(0.475,0.182) 1(0.475,0.887) 1(0.475,1.045) 1(0.476,0.022) 1(0.476,0.023) 1(0.476,0.887) 1(0.479,0.887) 1(0.481,0.019) 1(0.481,0.02) 1(0.481,0.178) 1(0.481,0.179) 1(0.481,0.887) 1(0.482,0.019) 1(0.482,0.887) 1(0.487,0.889) 1(0.488,0.889) 1(0.49,0.176) 1(0.49,0.889) 1(0.49,0.89) 1(0.49,0.892) 1(0.49,1.048) 1(0.491,1.046) 1(0.494,0.173) 1(0.494,0.175) 1(0.497,1.049) 1(0.5,0.017) 1(0.5,0.019) 1(0.505,0.014) 1(0.505,0.016) 1(0.505,0.893) 1(0.506,0.014) 1(0.506,0.892) 1(0.506,0.893) 1(0.508,0.892) 1(0.508,0.893) 1(0.508,0.895) 1(0.509,0.896) 1(0.512,0.014) 1(0.512,0.172) 1(0.514,0.014) 1(0.515,1.051) 1(0.515,1.052) 1(0.517,0.17) 1(0.518,0.169) 1(0.518,1.054) 1(0.52,0.014) 1(0.52,0.167) 1(0.52,1.054) 1(0.521,0.167) 1(0.523,0.898) 1(0.524,0.014) 1(0.524,0.167) 1(0.524,0.896) 1(0.524,0.898) 1(0.526,0.896) 1(0.526,0.898) 1(0.526,1.054) 1(0.527,0.014) 1(0.527,0.167) 1(0.529,0.014) 1(0.53,0.014) 1(0.535,0.013) 1(0.535,0.167) 1(0.535,0.898) 1(0.536,0.167) 1(0.538,0.898) 1(0.538,0.899) 1(0.538,0.901) 1(0.539,0.167) 1(0.545,0.167) 1(0.547,0.011) 1(0.547,1.055) 1(0.55,0.166) 1(0.55,0.167) 1(0.551,0.902) 1(0.553,0.902) 1(0.553,1.055) 1(0.556,0.166) 1(0.557,0.166) 1(0.557,0.902) 1(0.559,0.902) 1(0.559,1.055) 1(0.56,0.902) 1(0.562,0.01) 1(0.562,0.164) 1(0.562,1.055) 1(0.563,0.163) 1(0.568,0.163) 1(0.568,1.055) 1(0.568,1.057) 1(0.572,0.163) 1(0.575,0.163) 1(0.581,0.163) 1(0.583,0.01) 1(0.584,0.01) 1(0.586,0.008) 1(0.587,0.008) 1(0.587,0.163) 1(0.589,0.008) 1(0.59,0.008) 1(0.601,0.163) 1(0.607,0.01) 1(0.607,0.163) 1(0.607,0.164) 1(0.608,0.01) 1(0.61,0.01) 1(0.61,1.057) 1(0.611,1.055) 1(0.614,0.166) 1(0.614,0.901) 1(0.614,0.902) 1(0.616,0.166) 1(0.616,0.901) 1(0.616,1.055) 1(0.617,0.902) 1(0.619,0.902) 1(0.62,1.055) 1(0.622,0.166) 1(0.622,0.167) 1(0.625,1.055) 1(0.626,0.011) 1(0.626,0.167) 1(0.629,1.055) 1(0.635,0.013) 1(0.635,0.167) 1(0.638,0.014) 1(0.638,0.016) 1(0.638,0.017) 